# Altium schematic symbol library lib_datalogger.SchLib: 1246 symbols (part 7 of 16)
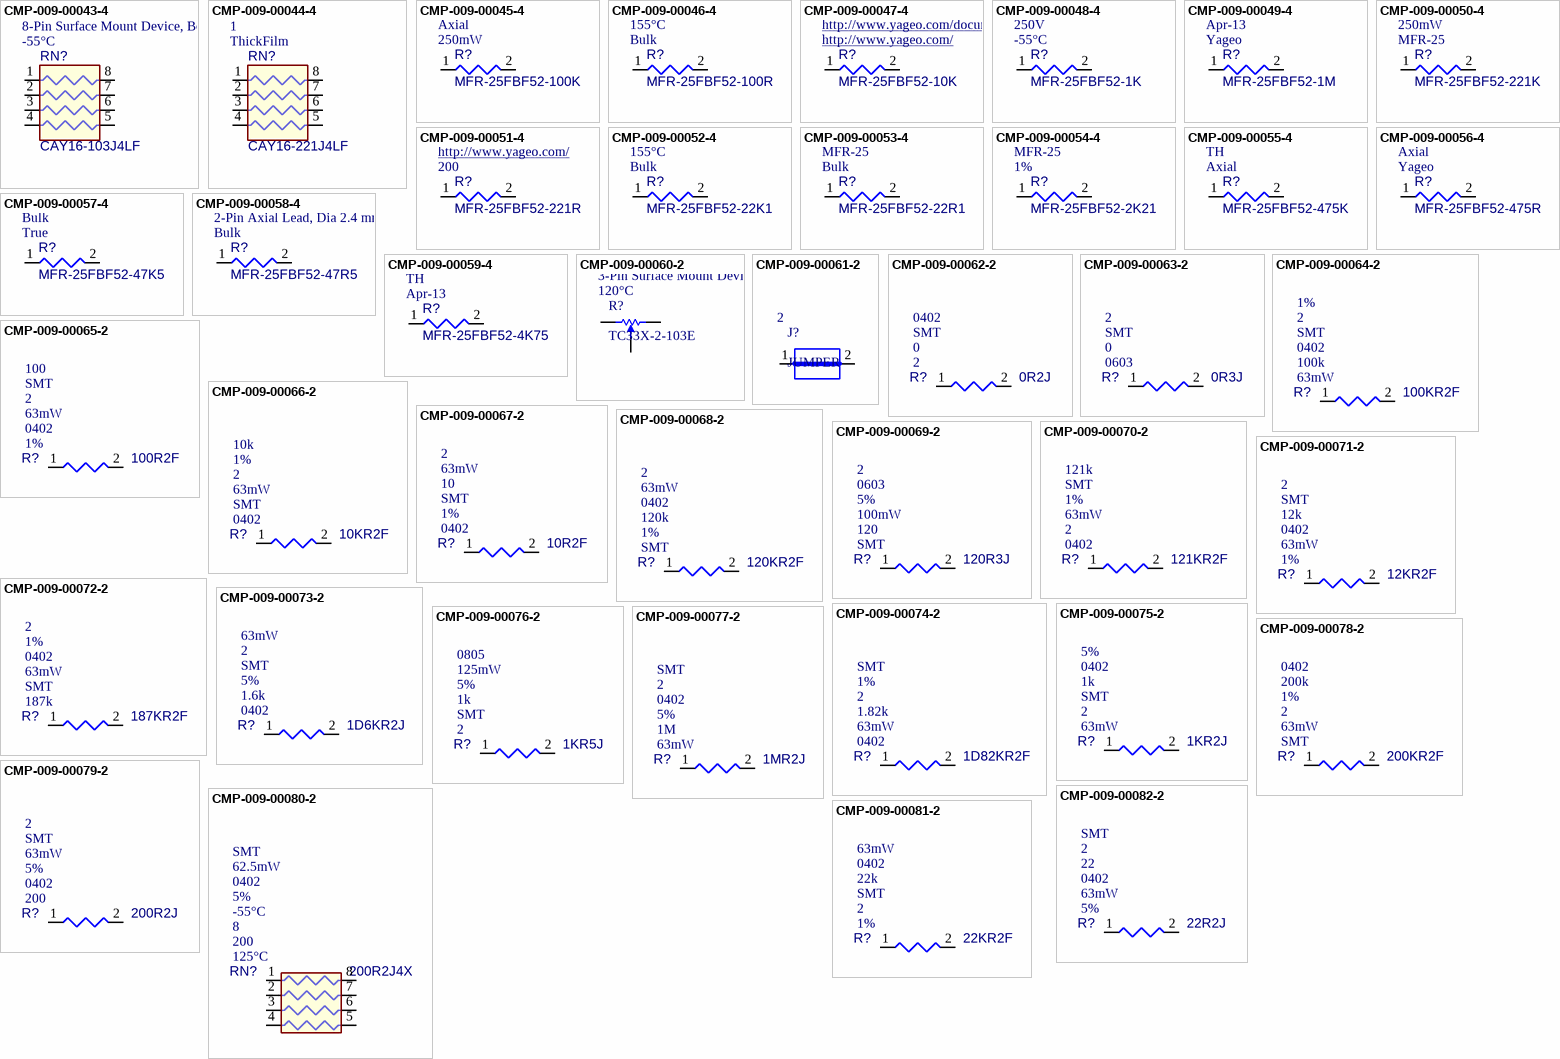
[diagram p49: symbols CMP-009-00043-4 to CMP-009-00082-2]

## CMP-009-00046-4
designator R?, comment MFR-25FBF52-100R  value 100  Packaging: Bulk  Max Operating Temperature: 155°C  Mounting Technology: TH  Datasheet Version: Apr-13  Manufacturer: Yageo  Case/Package: Axial  RoHS Compliant: True  Package Description: 2-Pin Axial Lead, Dia 2.4 mm, Body Length 6.3 mm  Package Quantity: 200  Package Reference: MFR-25  Voltage Rating: 250V  Tolerance: 1%  Power: 250mW  Composition: CarbonFilm  Min Operating Temperature: -55°C
Axial Resistor, 100 Ohm, +/- 1%, 0.25 W, -55 to 155 degC, 2-Pin THD, RoHS, Bulk; Datasheet URL: http://www.yageo.com/documents/recent/Yageo%20LR_MFR_2013.pdf; Manufacturer URL: http://www.yageo.com/
footprint RESC0805(2012)_L (Chip Resistor, Body 2.0x1.3mm, IPC High Density)
footprint RESA60-630X240-2 (Axial Resistor, 2-Leads, Dia 2.4mm, Body Length 6.3mm)
pins: 1, 2
1 alternate drawing of the same symbol

## CMP-009-00047-4
designator R?, comment MFR-25FBF52-10K  value 10k  Package Reference: MFR-25  Min Operating Temperature: -55°C  Mounting Technology: TH  Package Quantity: 200  Case/Package: Axial  Tolerance: 1%  RoHS Compliant: True  Datasheet Version: Apr-13  Packaging: Bulk  Power: 250mW  Manufacturer: Yageo  Voltage Rating: 250V  Max Operating Temperature: 155°C  Package Description: 2-Pin Axial Lead, Dia 2.4 mm, Body Length 6.3 mm
Axial Resistor, 10 KOhm, +/- 1%, 0.25 W, -55 to 155 degC, 2-Pin THD, RoHS, Bulk; Manufacturer URL: http://www.yageo.com/; Datasheet URL: http://www.yageo.com/documents/recent/Yageo%20LR_MFR_2013.pdf
footprint RESC0805(2012)_L (Chip Resistor, Body 2.0x1.3mm, IPC High Density)
footprint RESA60-630X240-2 (Axial Resistor, 2-Leads, Dia 2.4mm, Body Length 6.3mm)
pins: 1, 2
1 alternate drawing of the same symbol

## CMP-009-00048-4
designator R?, comment MFR-25FBF52-1K  value 1k  Min Operating Temperature: -55°C  Voltage Rating: 250V  Max Operating Temperature: 155°C  Tolerance: 1%  Package Reference: MFR-25  Composition: CarbonFilm  Mounting Technology: TH  Packaging: Bulk  Case/Package: Axial  Package Quantity: 200  Package Description: 2-Pin Axial Lead, Dia 2.4 mm, Body Length 6.3 mm  Datasheet Version: Apr-13  RoHS Compliant: True  Power: 250mW  Manufacturer: Yageo
Axial Resistor, 1 KOhm, +/- 1%, 250 mW, -55 to 155 degC, 2-Pin THD, RoHS, Bulk; Datasheet URL: http://www.yageo.com/documents/recent/Yageo%20LR_MFR_2013.pdf; Manufacturer URL: http://www.yageo.com/
footprint RESC0805(2012)_L (Chip Resistor, Body 2.0x1.3mm, IPC High Density)
footprint RESA60-630X240-2 (Axial Resistor, 2-Leads, Dia 2.4mm, Body Length 6.3mm)
pins: 1, 2
1 alternate drawing of the same symbol

## CMP-009-00049-4
designator R?, comment MFR-25FBF52-1M  value 1M  Manufacturer: Yageo  Datasheet Version: Apr-13  Voltage Rating: 250V  Package Reference: MFR-25  Package Quantity: 200  Min Operating Temperature: -55°C  RoHS Compliant: True  Mounting Technology: TH  Max Operating Temperature: 155°C  Package Description: 2-Pin Axial Lead, Dia 2.4 mm, Body Length 6.3 mm  Packaging: Bulk  Tolerance: 1%  Case/Package: Axial  Power: 250mW
Axial Resistor, 1 MOhm, +/- 1%, 250 mW, -55 to 155 degC, 2-Pin THD, RoHS, Bulk; Datasheet URL: http://www.yageo.com/documents/recent/Yageo%20LR_MFR_2013.pdf; Manufacturer URL: http://www.yageo.com/
footprint RESC0805(2012)_L (Chip Resistor, Body 2.0x1.3mm, IPC High Density)
footprint RESA60-630X240-2 (Axial Resistor, 2-Leads, Dia 2.4mm, Body Length 6.3mm)
pins: 1, 2
1 alternate drawing of the same symbol

## CMP-009-00050-4
designator R?, comment MFR-25FBF52-221K  value 221k  Package Reference: MFR-25  Power: 250mW  Package Quantity: 200  Packaging: Bulk  Voltage Rating: 250V  Package Description: 2-Pin Axial Lead, Dia 2.4 mm, Body Length 6.3 mm  Datasheet Version: Apr-13  Max Operating Temperature: 155°C  Min Operating Temperature: -55°C  Case/Package: Axial  Tolerance: 1%  RoHS Compliant: True  Mounting Technology: TH  Manufacturer: Yageo
Axial Resistor, 221 KOhm, +/- 1%, 0.25 W, -55 to 155 degC, 2-Pin THD, RoHS, Bulk; Datasheet URL: http://www.yageo.com/documents/recent/Yageo%20LR_MFR_2013.pdf; Manufacturer URL: http://www.yageo.com/
footprint RESC0805(2012)_L (Chip Resistor, Body 2.0x1.3mm, IPC High Density)
footprint RESA60-630X240-2 (Axial Resistor, 2-Leads, Dia 2.4mm, Body Length 6.3mm)
pins: 1, 2
1 alternate drawing of the same symbol

## CMP-009-00051-4
designator R?, comment MFR-25FBF52-221R  value 221  Package Quantity: 200  Case/Package: Axial  Package Reference: MFR-25  RoHS Compliant: True  Mounting Technology: TH  Power: 250mW  Packaging: Bulk  Package Description: 2-Pin Axial Lead, Dia 2.4 mm, Body Length 6.3 mm  Max Operating Temperature: 155°C  Voltage Rating: 250V  Tolerance: 1%  Manufacturer: Yageo  Datasheet Version: Apr-13  Min Operating Temperature: -55°C
Axial Resistor, 221 Ohm, +/- 1%, 250 mW, -55 to 155 degC, 2-Pin THD, RoHS, Bulk; Manufacturer URL: http://www.yageo.com/; Datasheet URL: http://www.yageo.com/documents/recent/Yageo%20LR_MFR_2013.pdf
footprint RESC0805(2012)_L (Chip Resistor, Body 2.0x1.3mm, IPC High Density)
footprint RESA60-630X240-2 (Axial Resistor, 2-Leads, Dia 2.4mm, Body Length 6.3mm)
pins: 1, 2
1 alternate drawing of the same symbol

## CMP-009-00052-4
designator R?, comment MFR-25FBF52-22K1  value 22.1k  Packaging: Bulk  Max Operating Temperature: 155°C  Case/Package: Axial  Tolerance: 1%  Mounting Technology: TH  Min Operating Temperature: -55°C  RoHS Compliant: True  Package Quantity: 200  Package Reference: MFR-25  Power: 250mW  Manufacturer: Yageo  Package Description: 2-Pin Axial Lead, Dia 2.4 mm, Body Length 6.3 mm  Datasheet Version: Apr-13  Voltage Rating: 250V
Axial Resistor, 22.1 KOhm, +/- 1%, 0.25 W, -55 to 155 degC, 2-Pin THD, RoHS, Bulk; Manufacturer URL: http://www.yageo.com/; Datasheet URL: http://www.yageo.com/documents/recent/Yageo%20LR_MFR_2013.pdf
footprint RESC0805(2012)_L (Chip Resistor, Body 2.0x1.3mm, IPC High Density)
footprint RESA60-630X240 (Axial Resistor, 2-Leads, Dia 2.4mm, Body Length 6.3mm)
pins: 1, 2
1 alternate drawing of the same symbol

## CMP-009-00053-4
designator R?, comment MFR-25FBF52-22R1  value 22.1  Packaging: Bulk  Package Reference: MFR-25  Min Operating Temperature: -55°C  Power: 250mW  Manufacturer: Yageo  Mounting Technology: TH  Case/Package: Axial  Datasheet Version: Apr-13  Tolerance: 1%  RoHS Compliant: True  Package Description: 2-Pin Axial Lead, Dia 2.4 mm, Body Length 6.3 mm  Package Quantity: 200  Max Operating Temperature: 155°C  Voltage Rating: 250V
Axial Resistor, 22.1 Ohm, +/- 1%, 250 mW, -55 to 155 degC, 2-Pin THD, RoHS, Bulk; Manufacturer URL: http://www.yageo.com/; Datasheet URL: http://www.yageo.com/documents/recent/Yageo%20LR_MFR_2013.pdf
footprint RESC0805(2012)_L (Chip Resistor, Body 2.0x1.3mm, IPC High Density)
footprint RESA60-630X240-2 (Axial Resistor, 2-Leads, Dia 2.4mm, Body Length 6.3mm)
pins: 1, 2
1 alternate drawing of the same symbol

## CMP-009-00054-4
designator R?, comment MFR-25FBF52-2K21  value 2.21k  Tolerance: 1%  Package Reference: MFR-25  Packaging: Bulk  Voltage Rating: 250V  Datasheet Version: Apr-13  Power: 250mW  Package Description: 2-Pin Axial Lead, Dia 2.4 mm, Body Length 6.3 mm  Mounting Technology: TH  Manufacturer: Yageo  RoHS Compliant: True  Package Quantity: 200  Min Operating Temperature: -55°C  Case/Package: Axial  Max Operating Temperature: 155°C
Axial Resistor, 2.21 KOhm, +/- 1%, 0.25 W, -55 to 155 degC, 2-Pin THD, RoHS, Bulk; Manufacturer URL: http://www.yageo.com/; Datasheet URL: http://www.yageo.com/documents/recent/Yageo%20LR_MFR_2013.pdf
footprint RESC0805(2012)_L (Chip Resistor, Body 2.0x1.3mm, IPC High Density)
footprint RESA60-630X240 (Axial Resistor, 2-Leads, Dia 2.4mm, Body Length 6.3mm)
pins: 1, 2
1 alternate drawing of the same symbol

## CMP-009-00055-4
designator R?, comment MFR-25FBF52-475K  value 475k  Case/Package: Axial  Mounting Technology: TH  RoHS Compliant: True  Power: 250mW  Package Description: 2-Pin Axial Lead, Dia 2.4 mm, Body Length 6.3 mm  Min Operating Temperature: -55°C  Package Quantity: 200  Package Reference: MFR-25  Voltage Rating: 250V  Max Operating Temperature: 155°C  Datasheet Version: Apr-13  Tolerance: 1%  Packaging: Bulk  Manufacturer: Yageo
Axial Resistor, 475 KOhm, +/- 1%, 0.25 W, -55 to 155 degC, 2-Pin THD, RoHS, Bulk; Datasheet URL: http://www.yageo.com/documents/recent/Yageo%20LR_MFR_2013.pdf; Manufacturer URL: http://www.yageo.com/
footprint RESC0805(2012)_L (Chip Resistor, Body 2.0x1.3mm, IPC High Density)
footprint RESA60-630X240-2 (Axial Resistor, 2-Leads, Dia 2.4mm, Body Length 6.3mm)
pins: 1, 2
1 alternate drawing of the same symbol

## CMP-009-00056-4
designator R?, comment MFR-25FBF52-475R  value 475  Manufacturer: Yageo  Case/Package: Axial  Tolerance: 1%  RoHS Compliant: True  Mounting Technology: TH  Voltage Rating: 250V  Packaging: Bulk  Package Description: 2-Pin Axial Lead, Dia 2.4 mm, Body Length 6.3 mm  Max Operating Temperature: 155°C  Package Reference: MFR-25  Datasheet Version: Apr-13  Min Operating Temperature: -55°C  Power: 250mW  Package Quantity: 200
Axial Resistor, 475 Ohm, +/- 1%, 0.25 W, -55 to 155 degC, 2-Pin THD, RoHS, Bulk; Datasheet URL: http://www.yageo.com/documents/recent/Yageo%20LR_MFR_2013.pdf; Manufacturer URL: http://www.yageo.com/
footprint RESC0805(2012)_L (Chip Resistor, Body 2.0x1.3mm, IPC High Density)
footprint RESA60-630X240-2 (Axial Resistor, 2-Leads, Dia 2.4mm, Body Length 6.3mm)
pins: 1, 2
1 alternate drawing of the same symbol

## CMP-009-00057-4
designator R?, comment MFR-25FBF52-47K5  value 47.5k  RoHS Compliant: True  Packaging: Bulk  Package Quantity: 200  Manufacturer: Yageo  Voltage Rating: 250V  Case/Package: Axial  Package Reference: MFR-25  Tolerance: 1%  Max Operating Temperature: 155°C  Package Description: 2-Pin Axial Lead, Dia 2.4 mm, Body Length 6.3 mm  Power: 250mW  Datasheet Version: Apr-13  Min Operating Temperature: -55°C  Mounting Technology: TH
Axial Resistor, 47.5 KOhm, +/- 1%, 0.25 W, -55 to 155 degC, 2-Pin THD, RoHS, Bulk; Manufacturer URL: http://www.yageo.com/; Datasheet URL: http://www.yageo.com/documents/recent/Yageo%20LR_MFR_2013.pdf
footprint RESC0805(2012)_L (Chip Resistor, Body 2.0x1.3mm, IPC High Density)
footprint RESA60-630X240 (Axial Resistor, 2-Leads, Dia 2.4mm, Body Length 6.3mm)
pins: 1, 2
1 alternate drawing of the same symbol

## CMP-009-00058-4
designator R?, comment MFR-25FBF52-47R5  value 47.5  Packaging: Bulk  Package Description: 2-Pin Axial Lead, Dia 2.4 mm, Body Length 6.3 mm  Package Reference: MFR-25  Voltage Rating: 250V  Manufacturer: Yageo  Case/Package: Axial  Tolerance: 1%  RoHS Compliant: True  Package Quantity: 200  Max Operating Temperature: 155°C  Power: 250mW  Min Operating Temperature: -55°C  Datasheet Version: Apr-13  Mounting Technology: TH
Axial Resistor, 47.5 Ohm, +/- 1%, 0.25 W, -55 to 155 degC, 2-Pin THD, RoHS, Bulk; Manufacturer URL: http://www.yageo.com/; Datasheet URL: http://www.yageo.com/documents/recent/Yageo%20LR_MFR_2013.pdf
footprint RESC0805(2012)_L (Chip Resistor, Body 2.0x1.3mm, IPC High Density)
footprint RESA60-630X240 (Axial Resistor, 2-Leads, Dia 2.4mm, Body Length 6.3mm)
pins: 1, 2
1 alternate drawing of the same symbol

## CMP-009-00059-4
designator R?, comment MFR-25FBF52-4K75  value 4.75k  Datasheet Version: Apr-13  Mounting Technology: TH  Voltage Rating: 250V  Package Reference: MFR-25  RoHS Compliant: True  Composition: MetalFilm  Max Operating Temperature: 155°C  Package Quantity: 200  Power: 250mW  Case/Package: Axial  Package Description: 2-Pin Axial Lead, Dia 2.4 mm, Body Length 6.3 mm  Tolerance: 1%  Packaging: Bulk  Manufacturer: Yageo  Min Operating Temperature: -55°C
Axial Resistor, 4.75 KOhm, +/- 1%, 0.25 W, -55 to 155 degC, 2-Pin THD, RoHS, Bulk; Datasheet URL: http://www.yageo.com/documents/recent/Yageo%20LR_MFR_2013.pdf; Manufacturer URL: http://www.yageo.com/
footprint RESC0805(2012)_L (Chip Resistor, Body 2.0x1.3mm, IPC High Density)
footprint RESA60-630X240-2 (Axial Resistor, 2-Leads, Dia 2.4mm, Body Length 6.3mm)
pins: 1, 2
1 alternate drawing of the same symbol

## CMP-009-00060-2
designator R?, comment TC33X-2-103E  Max Operating Temperature: 120°C  Package Description: 3-Pin Surface Mount Device, Body 3.8 x 3.6 mm  Datasheet Version: Aug-16  RoHS Compliant: True  Mounting Technology: SM  Tolerance: 25%  Power: 100mW  Package Quantity: 2500  Case/Package: TC33X-2  Composition: Potentiometer  Packaging: TapeandReel  Min Operating Temperature: -40°C  Resistance: 10k  Manufacturer: Bourns
Trimming Potentiometer, 10000 Ohm, -40 to 100 degC, 3-Pin SMD, RoHS, Tape and Reel; Manufacturer URL: http://www.bourns.com/; Datasheet URL: http://www.bourns.com/docs/Product-Datasheets/TC33.pdf; Package Reference: TC33X-2
footprint BOUR-TC33X-2_V (SMD, 3-Leads, Body 3.8x3.6mm)
pins: 1, 2, 3

## CMP-009-00061-2
designator J?, comment JUMPER  Pins: 2
footprint Altium-Jumper
footprint JUMPER
pins: 1, 2

## CMP-009-00062-2
designator R?, comment 0R2J  value 0  Pins: 2  Mounting Technology: SMT  Case/Package: 0402
Jumper 0402 (1005 Metric); Value: 0.00 Ohm; Case-Metric: 1005; Technology: SMT; Case-EIA: 0402
footprint RESC0402(1005)_L (Chip Resistor, Body 1.0x0.5mm, IPC High Density)
footprint RESC0402(1005)_L (Chip Resistor, Body 1.0x0.5mm, IPC High Density)
pins: 1, 2
1 alternate drawing of the same symbol

## CMP-009-00063-2
designator R?, comment 0R3J  value 0  Case/Package: 0603  Mounting Technology: SMT  Pins: 2
Jumper 0603 (1608 Metric); Case-Metric: 1608; Value: 0.00 Ohm; Technology: SMT; Case-EIA: 0603
footprint RESC0603(1608)_L (Chip Resistor, Body 1.6x0.8mm, IPC High Density)
footprint RESC0603(1608)_L (Chip Resistor, Body 1.6x0.8mm, IPC High Density)
pins: 1, 2
1 alternate drawing of the same symbol

## CMP-009-00064-2
designator R?, comment 100KR2F  value 100k  Power: 63mW  Case/Package: 0402  Mounting Technology: SMT  Pins: 2  Tolerance: 1%
100K 0.063W 1% 0402 (1005 Metric)  SMD; Case-Metric: 1005; Value: 100000.00 Ohm; Technology: SMT; Tolerance: 1 %; Power: 0.063 W; Case-EIA: 0402
footprint RESC0402(1005)_L (Chip Resistor, Body 1.0x0.5mm, IPC High Density)
footprint RESC0402(1005)_L (Chip Resistor, Body 1.0x0.5mm, IPC High Density)
pins: 1, 2
1 alternate drawing of the same symbol

## CMP-009-00065-2
designator R?, comment 100R2F  value 100  Tolerance: 1%  Case/Package: 0402  Power: 63mW  Pins: 2  Mounting Technology: SMT
100R 0.063W 1% 0402 (1005 Metric)  SMD; Value: 100.00 Ohm; Case-Metric: 1005; Technology: SMT; Case-EIA: 0402; Tolerance: 1 %; Power: 0.063 W
footprint RESC0402(1005)_L (Chip Resistor, Body 1.0x0.5mm, IPC High Density)
footprint RESC0402(1005)_L (Chip Resistor, Body 1.0x0.5mm, IPC High Density)
pins: 1, 2
1 alternate drawing of the same symbol

## CMP-009-00066-2
designator R?, comment 10KR2F  value 10k  Case/Package: 0402  Mounting Technology: SMT  Power: 63mW  Pins: 2  Tolerance: 1%
10K 0.063W 1% 0402 (1005 Metric)  SMD; Value: 10000.00 Ohm; Case-Metric: 1005; Case-EIA: 0402; Technology: SMT; Tolerance: 1 %; Power: 0.063 W
footprint RESC0402(1005)_L (Chip Resistor, Body 1.0x0.5mm, IPC High Density)
footprint RESC0402(1005)_L (Chip Resistor, Body 1.0x0.5mm, IPC High Density)
pins: 1, 2
1 alternate drawing of the same symbol

## CMP-009-00067-2
designator R?, comment 10R2F  value 10  Case/Package: 0402  Tolerance: 1%  Mounting Technology: SMT  Power: 63mW  Pins: 2
10R 0.063W 1% 0402 (1005 Metric)  SMD; Case-Metric: 1005; Value: 10.00 Ohm; Power: 0.063 W; Technology: SMT; Tolerance: 1 %; Case-EIA: 0402
footprint RESC0402(1005)_L (Chip Resistor, Body 1.0x0.5mm, IPC High Density)
footprint RESC0402(1005)_L (Chip Resistor, Body 1.0x0.5mm, IPC High Density)
pins: 1, 2
1 alternate drawing of the same symbol

## CMP-009-00068-2
designator R?, comment 120KR2F  value 120k  Mounting Technology: SMT  Tolerance: 1%  Case/Package: 0402  Power: 63mW  Pins: 2
120K 0.063W 1% 0402 (1005 Metric)  SMD; Case-Metric: 1005; Value: 120000.00 Ohm; Case-EIA: 0402; Technology: SMT; Tolerance: 1 %; Power: 0.063 W
footprint RESC0402(1005)_L (Chip Resistor, Body 1.0x0.5mm, IPC High Density)
footprint RESC0402(1005)_L (Chip Resistor, Body 1.0x0.5mm, IPC High Density)
pins: 1, 2
1 alternate drawing of the same symbol

## CMP-009-00069-2
designator R?, comment 120R3J  value 120  Mounting Technology: SMT  Power: 100mW  Tolerance: 5%  Case/Package: 0603  Pins: 2
120R 0.1W 5% 0603 (1608 Metric)  SMD; Case-Metric: 1608; Value: 120.00 Ohm; Tolerance: 5 %; Power: 0.1 W; Technology: SMT; Case-EIA: 0603
footprint RESC0603(1608)_L (Chip Resistor, Body 1.6x0.8mm, IPC High Density)
footprint RESC0603(1608)_L (Chip Resistor, Body 1.6x0.8mm, IPC High Density)
pins: 1, 2
1 alternate drawing of the same symbol

## CMP-009-00070-2
designator R?, comment 121KR2F  value 121k  Case/Package: 0402  Pins: 2  Power: 63mW  Tolerance: 1%  Mounting Technology: SMT
121K 0.063W 1% 0402 (1005 Metric)  SMD; Value: 121000.00 Ohm; Case-Metric: 1005; Power: 0.063 W; Case-EIA: 0402; Tolerance: 1 %; Technology: SMT
footprint RESC0402(1005)_L (Chip Resistor, Body 1.0x0.5mm, IPC High Density)
footprint RESC0402(1005)_L (Chip Resistor, Body 1.0x0.5mm, IPC High Density)
pins: 1, 2
1 alternate drawing of the same symbol

## CMP-009-00071-2
designator R?, comment 12KR2F  value 12k  Tolerance: 1%  Power: 63mW  Case/Package: 0402  Mounting Technology: SMT  Pins: 2
12K 0.063W 1% 0402 (1005 Metric)  SMD; Case-Metric: 1005; Value: 12000.00 Ohm; Tolerance: 1 %; Case-EIA: 0402; Technology: SMT; Power: 0.063 W
footprint RESC0402(1005)_L (Chip Resistor, Body 1.0x0.5mm, IPC High Density)
footprint RESC0402(1005)_L (Chip Resistor, Body 1.0x0.5mm, IPC High Density)
pins: 1, 2
1 alternate drawing of the same symbol

## CMP-009-00072-2
designator R?, comment 187KR2F  value 187k  Mounting Technology: SMT  Power: 63mW  Case/Package: 0402  Tolerance: 1%  Pins: 2
187K 0.063W 1% 0402 (1005 Metric)  SMD; Value: 187000.00 Ohm; Case-Metric: 1005; Power: 0.063 W; Case-EIA: 0402; Tolerance: 1 %; Technology: SMT
footprint RESC0402(1005)_L (Chip Resistor, Body 1.0x0.5mm, IPC High Density)
footprint RESC0402(1005)_L (Chip Resistor, Body 1.0x0.5mm, IPC High Density)
pins: 1, 2
1 alternate drawing of the same symbol

## CMP-009-00073-2
designator R?, comment 1D6KR2J  value 1.6k  Case/Package: 0402  Tolerance: 5%  Mounting Technology: SMT  Pins: 2  Power: 63mW
1K6 0.063W 5% 0402 (1005 Metric)  SMD; Case-Metric: 1005; Value: 1600.00 Ohm; Case-EIA: 0402; Tolerance: 5 %; Technology: SMT; Power: 0.063 W
footprint RESC0402(1005)_L (Chip Resistor, Body 1.0x0.5mm, IPC High Density)
footprint RESC0402(1005)_L (Chip Resistor, Body 1.0x0.5mm, IPC High Density)
pins: 1, 2
1 alternate drawing of the same symbol

## CMP-009-00074-2
designator R?, comment 1D82KR2F  value 1.82k  Case/Package: 0402  Power: 63mW  Pins: 2  Tolerance: 1%  Mounting Technology: SMT
1K82 0.063W 1% 0402 (1005 Metric)  SMD; Case-Metric: 1005; Value: 1820.00 Ohm; Case-EIA: 0402; Power: 0.063 W; Tolerance: 1 %; Technology: SMT
footprint RESC0402(1005)_L (Chip Resistor, Body 1.0x0.5mm, IPC High Density)
footprint RESC0402(1005)_L (Chip Resistor, Body 1.0x0.5mm, IPC High Density)
pins: 1, 2
1 alternate drawing of the same symbol

## CMP-009-00075-2
designator R?, comment 1KR2J  value 1k  Power: 63mW  Pins: 2  Mounting Technology: SMT  Case/Package: 0402  Tolerance: 5%
1K 0.063W 5% 0402 (1005 Metric)  SMD; Value: 1000.00 Ohm; Case-Metric: 1005; Tolerance: 5 %; Power: 0.063 W; Case-EIA: 0402; Technology: SMT
footprint RESC0402(1005)_L (Chip Resistor, Body 1.0x0.5mm, IPC High Density)
footprint RESC0402(1005)_L (Chip Resistor, Body 1.0x0.5mm, IPC High Density)
pins: 1, 2
1 alternate drawing of the same symbol

## CMP-009-00076-2
designator R?, comment 1KR5J  value 1k  Pins: 2  Mounting Technology: SMT  Tolerance: 5%  Power: 125mW  Case/Package: 0805
1K 0.125W 5% 0805 (2012 Metric)  SMD; Value: 1000.00 Ohm; Case-Metric: 2012; Power: 0.125 W; Case-EIA: 0805; Technology: SMT
footprint RESC0805(2012)_L (Chip Resistor, Body 2.0x1.3mm, IPC High Density)
footprint RESC0805(2012)_L-4 (Chip Resistor, Body 2.0x1.3mm, IPC High Density)
pins: 1, 2
1 alternate drawing of the same symbol

## CMP-009-00077-2
designator R?, comment 1MR2J  value 1M  Power: 63mW  Tolerance: 5%  Case/Package: 0402  Pins: 2  Mounting Technology: SMT
1M 0.063W 5% 0402 (1005 Metric)  SMD; Case-Metric: 1005; Value: 1000000.00 Ohm; Tolerance: 5 %; Technology: SMT; Case-EIA: 0402; Power: 0.063 W
footprint RESC0402(1005)_L (Chip Resistor, Body 1.0x0.5mm, IPC High Density)
footprint RESC0402(1005)_L (Chip Resistor, Body 1.0x0.5mm, IPC High Density)
pins: 1, 2
1 alternate drawing of the same symbol

## CMP-009-00078-2
designator R?, comment 200KR2F  value 200k  Mounting Technology: SMT  Power: 63mW  Pins: 2  Tolerance: 1%  Case/Package: 0402
200K 0.063W 1% 0402 (1005 Metric)  SMD; Case-Metric: 1005; Value: 200000.00 Ohm; Power: 0.063 W; Technology: SMT; Tolerance: 1 %; Case-EIA: 0402
footprint RESC0402(1005)_L (Chip Resistor, Body 1.0x0.5mm, IPC High Density)
footprint RESC0402(1005)_L (Chip Resistor, Body 1.0x0.5mm, IPC High Density)
pins: 1, 2
1 alternate drawing of the same symbol

## CMP-009-00079-2
designator R?, comment 200R2J  value 200  Case/Package: 0402  Tolerance: 5%  Power: 63mW  Mounting Technology: SMT  Pins: 2
200R 0.063W 5% 0402 (1005 Metric)  SMD; Value: 200.00 Ohm; Case-Metric: 1005; Technology: SMT; Power: 0.063 W; Case-EIA: 0402; Tolerance: 5 %
footprint RESC0402(1005)_L (Chip Resistor, Body 1.0x0.5mm, IPC High Density)
footprint RESC0402(1005)_L (Chip Resistor, Body 1.0x0.5mm, IPC High Density)
pins: 1, 2
1 alternate drawing of the same symbol

## CMP-009-00080-2
designator RN?, comment 200R2J4X  value 200  Max Operating Temperature: 125°C  Pins: 8  Min Operating Temperature: -55°C  Tolerance: 5%  Case/Package: 0402  Power: 62.5mW  Mounting Technology: SMT
Res Thick Film Array 200 Ohm 5% ±200ppm/C ISOL Molded 8-Pin 0804(4 X 0402) Convex SMD Punched Carrier T/R; Value: 200.00 Ohm; Power: 0.0625 W; Case-Metric: 1005; Case-EIA: 0402; Technology: SMT
footprint Panasonic_EXB28 (Resistor network, 0402x4, convex terminal)
footprint Panasonic_EXB28 (Resistor network, 0402x4, convex terminal)
pins: 1, 2 1, 3 1, 4 1, 5 2, 6 2, 7 2, 8 2

## CMP-009-00081-2
designator R?, comment 22KR2F  value 22k  Tolerance: 1%  Pins: 2  Mounting Technology: SMT  Case/Package: 0402  Power: 63mW
22K 0.063W 1% 0402 (1005 Metric)  SMD; Value: 22000.00 Ohm; Case-Metric: 1005; Case-EIA: 0402; Power: 0.063 W; Technology: SMT; Tolerance: 1 %
footprint RESC0402(1005)_L (Chip Resistor, Body 1.0x0.5mm, IPC High Density)
footprint RESC0402(1005)_L (Chip Resistor, Body 1.0x0.5mm, IPC High Density)
pins: 1, 2
1 alternate drawing of the same symbol

## CMP-009-00082-2
designator R?, comment 22R2J  value 22  Tolerance: 5%  Power: 63mW  Case/Package: 0402  Pins: 2  Mounting Technology: SMT
22R 0.063W 5% 0402 (1005 Metric)  SMD; Value: 22.00 Ohm; Case-Metric: 1005; Case-EIA: 0402; Technology: SMT; Power: 0.063 W; Tolerance: 5 %
footprint RESC0402(1005)_L (Chip Resistor, Body 1.0x0.5mm, IPC High Density)
footprint RESC0402(1005)_L (Chip Resistor, Body 1.0x0.5mm, IPC High Density)
pins: 1, 2
1 alternate drawing of the same symbol

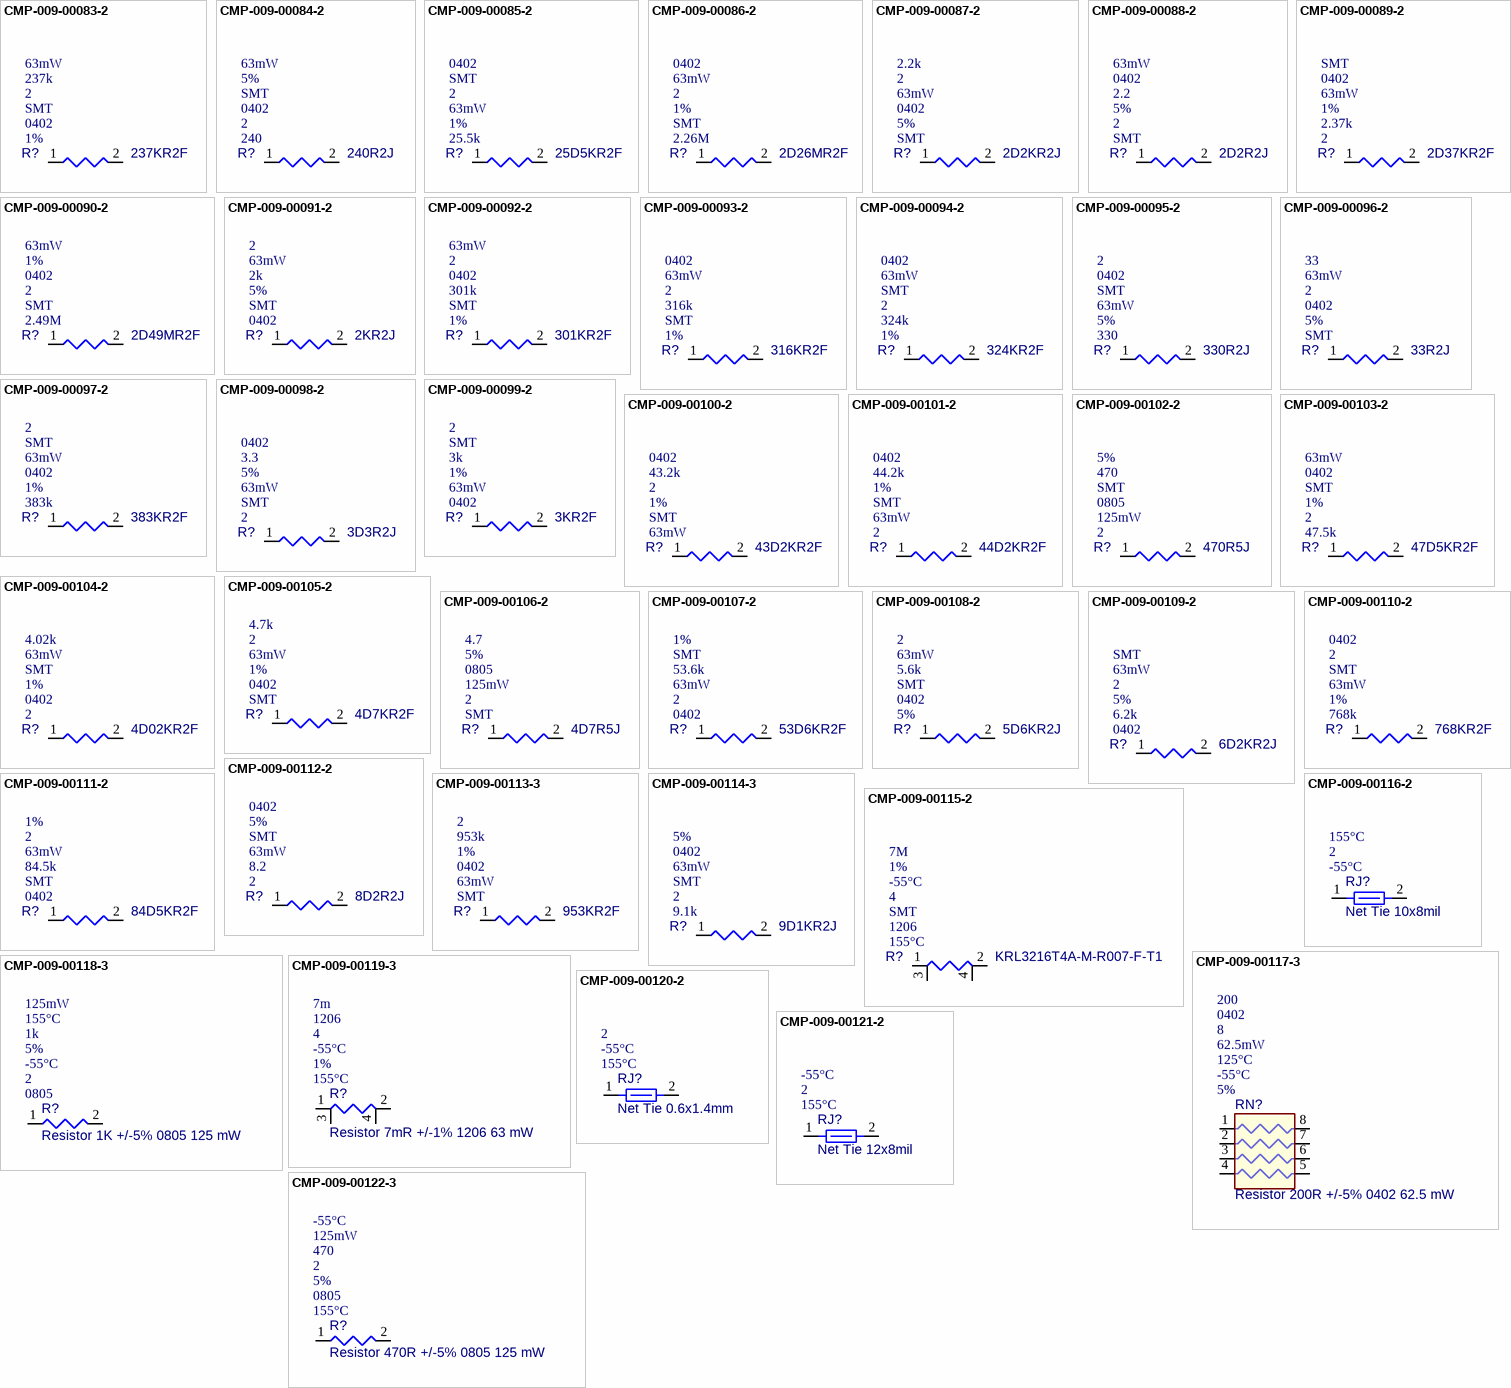
[diagram p19: symbols CMP-009-00083-2 to CMP-009-00122-3]

## CMP-009-00083-2
designator R?, comment 237KR2F  value 237k  Tolerance: 1%  Case/Package: 0402  Mounting Technology: SMT  Pins: 2  Power: 63mW
237K 0.063W 1% 0402 (1005 Metric)  SMD; Value: 237000.00 Ohm; Case-Metric: 1005; Tolerance: 1 %; Power: 0.063 W; Technology: SMT; Case-EIA: 0402
footprint RESC0402(1005)_L (Chip Resistor, Body 1.0x0.5mm, IPC High Density)
footprint RESC0402(1005)_L (Chip Resistor, Body 1.0x0.5mm, IPC High Density)
pins: 1, 2
1 alternate drawing of the same symbol

## CMP-009-00084-2
designator R?, comment 240R2J  value 240  Pins: 2  Case/Package: 0402  Mounting Technology: SMT  Tolerance: 5%  Power: 63mW
240R 0.063W 5% 0402 (1005 Metric)  SMD; Value: 240.00 Ohm; Case-Metric: 1005; Technology: SMT; Power: 0.063 W; Tolerance: 5 %; Case-EIA: 0402
footprint RESC0402(1005)_L (Chip Resistor, Body 1.0x0.5mm, IPC High Density)
footprint RESC0402(1005)_L (Chip Resistor, Body 1.0x0.5mm, IPC High Density)
pins: 1, 2
1 alternate drawing of the same symbol

## CMP-009-00085-2
designator R?, comment 25D5KR2F  value 25.5k  Tolerance: 1%  Power: 63mW  Pins: 2  Mounting Technology: SMT  Case/Package: 0402
25K5 0.063W 1% 0402 (1005 Metric)  SMD; Case-Metric: 1005; Value: 25500.00 Ohm; Case-EIA: 0402; Power: 0.063 W; Tolerance: 1 %; Technology: SMT
footprint RESC0402(1005)_L (Chip Resistor, Body 1.0x0.5mm, IPC High Density)
footprint RESC0402(1005)_L (Chip Resistor, Body 1.0x0.5mm, IPC High Density)
pins: 1, 2
1 alternate drawing of the same symbol

## CMP-009-00086-2
designator R?, comment 2D26MR2F  value 2.26M  Mounting Technology: SMT  Tolerance: 1%  Pins: 2  Power: 63mW  Case/Package: 0402
2M26 0.063W 1% 0402 (1005 Metric)  SMD; Value: 2260000.00 Ohm; Case-Metric: 1005; Power: 0.063 W; Technology: SMT; Case-EIA: 0402; Tolerance: 1 %
footprint RESC0402(1005)_L (Chip Resistor, Body 1.0x0.5mm, IPC High Density)
footprint RESC0402(1005)_L (Chip Resistor, Body 1.0x0.5mm, IPC High Density)
pins: 1, 2
1 alternate drawing of the same symbol

## CMP-009-00087-2
designator R?, comment 2D2KR2J  value 2.2k  Mounting Technology: SMT  Tolerance: 5%  Case/Package: 0402  Power: 63mW  Pins: 2
2K2 0.063W 5% 0402 (1005 Metric)  SMD; Value: 2200.00 Ohm; Case-Metric: 1005; Power: 0.063 W; Tolerance: 5 %; Technology: SMT; Case-EIA: 0402
footprint RESC0402(1005)_L (Chip Resistor, Body 1.0x0.5mm, IPC High Density)
footprint RESC0402(1005)_L (Chip Resistor, Body 1.0x0.5mm, IPC High Density)
pins: 1, 2
1 alternate drawing of the same symbol

## CMP-009-00088-2
designator R?, comment 2D2R2J  value 2.2  Mounting Technology: SMT  Pins: 2  Tolerance: 5%  Case/Package: 0402  Power: 63mW
2R2 0.063W 5% 0402 (1005 Metric)  SMD; Value: 2.20 Ohm; Case-Metric: 1005; Case-EIA: 0402; Power: 0.063 W; Tolerance: 5 %; Technology: SMT
footprint RESC0402(1005)_L (Chip Resistor, Body 1.0x0.5mm, IPC High Density)
footprint RESC0402(1005)_L (Chip Resistor, Body 1.0x0.5mm, IPC High Density)
pins: 1, 2
1 alternate drawing of the same symbol

## CMP-009-00089-2
designator R?, comment 2D37KR2F  value 2.37k  Pins: 2  Tolerance: 1%  Power: 63mW  Case/Package: 0402  Mounting Technology: SMT
2K37 0.063W 1% 0402 (1005 Metric)  SMD; Value: 2370.00 Ohm; Case-Metric: 1005; Tolerance: 1 %; Technology: SMT; Case-EIA: 0402; Power: 0.063 W
footprint RESC0402(1005)_L (Chip Resistor, Body 1.0x0.5mm, IPC High Density)
footprint RESC0402(1005)_L (Chip Resistor, Body 1.0x0.5mm, IPC High Density)
pins: 1, 2
1 alternate drawing of the same symbol
